# Altium schematic symbol library Regulator_Switching.SchLib: 1070 symbols (part 6 of 9) (continued)
## R-782.5-0.5 (continued)

## R-782.5-1.0
designator *  value R-782.5-1.0
ki_keywords: dc-dc recom Step-Down DC/DC-Regulator; ki_description: 1A Step-Down DC/DC-Regulator, 4.75-18V input, 2.5V fixed Output Voltage, LM78xx replacement, -40°C to +85°C, SIP3; ki_fp_filters: Converter*DCDC*RECOM*R*78E*0.5*; Footprint: Converter_DCDC:Converter_DCDC_RECOM_R-78E-0.5_THT; Supplier: https://www.recom-power.com/pdf/Innoline/R-78xx-1.0.pdf
footprint Converter_DCDC_RECOM_R-78E-0.5_THT
pins: 1 IN (power), 2 GND (power), 3 OUT (power)

## R-783.3-0.5
designator *  value R-783.3-0.5
ki_keywords: dc-dc recom Step-Down DC/DC-Regulator; ki_description: 500mA Step-Down DC/DC-Regulator, 4.75-18V input, 3.3V fixed Output Voltage, LM78xx replacement, -40°C to +85°C, SIP3; ki_fp_filters: Converter*DCDC*RECOM*R*78E*0.5*; Footprint: Converter_DCDC:Converter_DCDC_RECOM_R-78E-0.5_THT; Supplier: https://www.recom-power.com/pdf/Innoline/R-78xx-0.5.pdf
footprint Converter_DCDC_RECOM_R-78E-0.5_THT
pins: 1 IN (power), 2 GND (power), 3 OUT (power)

## R-783.3-1.0
designator *  value R-783.3-1.0
ki_keywords: dc-dc recom Step-Down DC/DC-Regulator; ki_description: 1A Step-Down DC/DC-Regulator, 4.75-18V input, 3.3V fixed Output Voltage, LM78xx replacement, -40°C to +85°C, SIP3; ki_fp_filters: Converter*DCDC*RECOM*R*78E*0.5*; Footprint: Converter_DCDC:Converter_DCDC_RECOM_R-78E-0.5_THT; Supplier: https://www.recom-power.com/pdf/Innoline/R-78xx-1.0.pdf
footprint Converter_DCDC_RECOM_R-78E-0.5_THT
pins: 1 IN (power), 2 GND (power), 3 OUT (power)

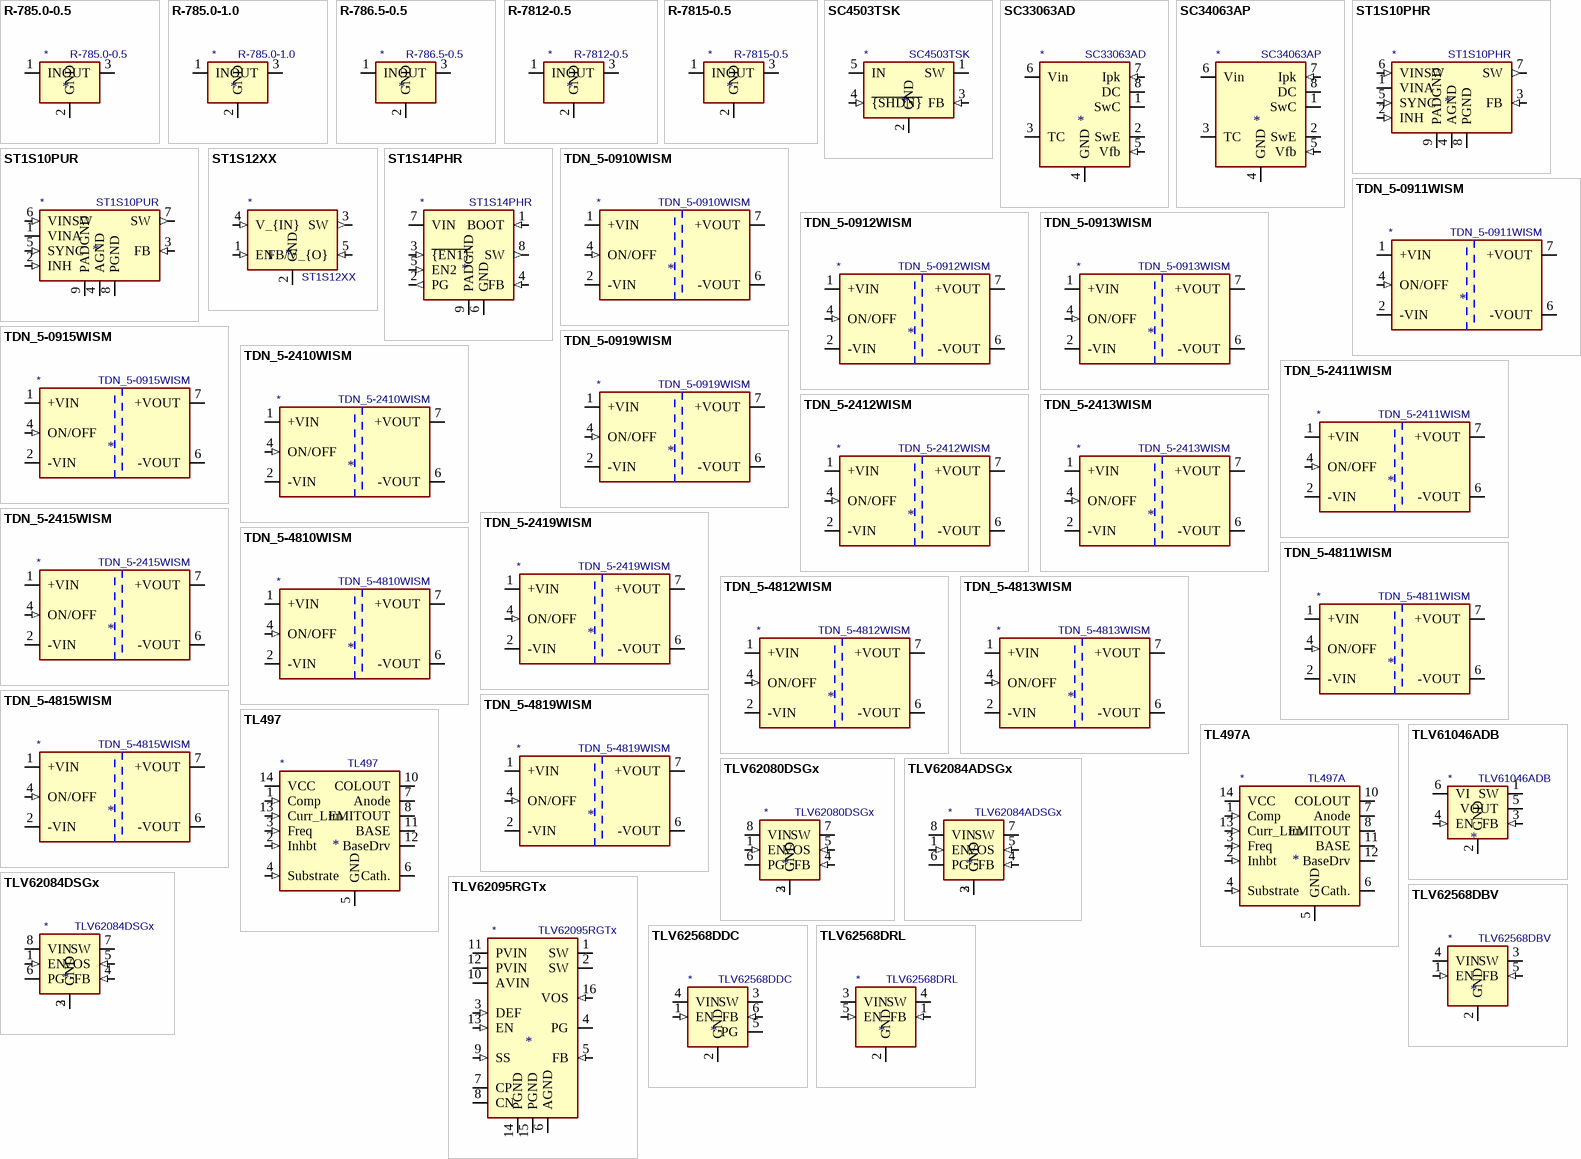
[diagram p18: symbols R-785.0-0.5 to TLV62568DRL]

## R-785.0-0.5
designator *  value R-785.0-0.5
ki_keywords: dc-dc recom Step-Down DC/DC-Regulator; ki_description: 500mA Step-Down DC/DC-Regulator, 6.5-18V input, 5V fixed Output Voltage, LM78xx replacement, -40°C to +85°C, SIP3; ki_fp_filters: Converter*DCDC*RECOM*R*78E*0.5*; Footprint: Converter_DCDC:Converter_DCDC_RECOM_R-78E-0.5_THT; Supplier: https://www.recom-power.com/pdf/Innoline/R-78xx-0.5.pdf
footprint Converter_DCDC_RECOM_R-78E-0.5_THT
pins: 1 IN (power), 2 GND (power), 3 OUT (power)

## R-785.0-1.0
designator *  value R-785.0-1.0
ki_keywords: dc-dc recom Step-Down DC/DC-Regulator; ki_description: 1A Step-Down DC/DC-Regulator, 6.5-18V input, 5V fixed Output Voltage, LM78xx replacement, -40°C to +85°C, SIP3; ki_fp_filters: Converter*DCDC*RECOM*R*78E*0.5*; Footprint: Converter_DCDC:Converter_DCDC_RECOM_R-78E-0.5_THT; Supplier: https://www.recom-power.com/pdf/Innoline/R-78xx-1.0.pdf
footprint Converter_DCDC_RECOM_R-78E-0.5_THT
pins: 1 IN (power), 2 GND (power), 3 OUT (power)

## R-786.5-0.5
designator *  value R-786.5-0.5
ki_keywords: dc-dc recom Step-Down DC/DC-Regulator; ki_description: 500mA Step-Down DC/DC-Regulator, 8-32V input, 6.5V fixed Output Voltage, LM78xx replacement, -40°C to +85°C, SIP3; ki_fp_filters: Converter*DCDC*RECOM*R*78E*0.5*; Footprint: Converter_DCDC:Converter_DCDC_RECOM_R-78E-0.5_THT; Supplier: https://www.recom-power.com/pdf/Innoline/R-78xx-0.5.pdf
footprint Converter_DCDC_RECOM_R-78E-0.5_THT
pins: 1 IN (power), 2 GND (power), 3 OUT (power)

## R-7812-0.5
designator *  value R-7812-0.5
ki_keywords: dc-dc recom Step-Down DC/DC-Regulator; ki_description: 500mA Step-Down DC/DC-Regulator, 15-32V input, 12V fixed Output Voltage, LM78xx replacement, -40°C to +85°C, SIP3; ki_fp_filters: Converter*DCDC*RECOM*R*78E*0.5*; Footprint: Converter_DCDC:Converter_DCDC_RECOM_R-78E-0.5_THT; Supplier: https://www.recom-power.com/pdf/Innoline/R-78xx-0.5.pdf
footprint Converter_DCDC_RECOM_R-78E-0.5_THT
pins: 1 IN (power), 2 GND (power), 3 OUT (power)

## R-7815-0.5
designator *  value R-7815-0.5
ki_keywords: dc-dc recom Step-Down DC/DC-Regulator; ki_description: 500mA Step-Down DC/DC-Regulator, 18-32V input, 15V fixed Output Voltage, LM78xx replacement, -40°C to +85°C, SIP3; ki_fp_filters: Converter*DCDC*RECOM*R*78E*0.5*; Footprint: Converter_DCDC:Converter_DCDC_RECOM_R-78E-0.5_THT; Supplier: https://www.recom-power.com/pdf/Innoline/R-78xx-0.5.pdf
footprint Converter_DCDC_RECOM_R-78E-0.5_THT
pins: 1 IN (power), 2 GND (power), 3 OUT (power)

## SC4503TSK
designator *  value SC4503TSK
ki_keywords: 1.9A 1.3MHz Step-Up DC/DC; ki_description: 1.9A, 1.3MHz Step-Up DC/DC Converter, 2.5V-20V output voltage, TSOT23; ki_fp_filters: TSOT*23*; Footprint: Package_TO_SOT_SMD:TSOT-23-5; Supplier: https://www.semtech.com/uploads/documents/sc4503.pdf
footprint TSOT-23-5
pins: 1 SW, 2 GND (power), 3 FB (in), 4 ~{{SHDN}} (in), 5 IN (power)

## SC33063AD
designator *  value SC33063AD
ki_keywords: smps buck boost inverting; ki_description: 1.5A, step-up/down/inverting switching regulator, 3-40V Vin, 100kHz, SO-8; ki_fp_filters: SOIC*3.9x4.9mm*P1.27mm*; Footprint: Package_SO:SOIC-8_3.9x4.9mm_P1.27mm; Supplier: http://www.onsemi.com/pub_link/Collateral/MC34063A-D.PDF
footprint SOIC-8_3.9x4.9mm_P1.27mm
pins: 1 SwC (oc), 2 SwE (oe), 3 TC, 4 GND (power), 5 Vfb (in), 6 Vin (power), 7 Ipk (in), 8 DC (oc)

## SC34063AP
designator *  value SC34063AP
ki_keywords: smps buck boost inverting; ki_description: 1.5A, step-up/down/inverting switching regulator, 3-40V Vin, 100kHz, DIP-8; ki_fp_filters: DIP*W7.62mm*; Footprint: Package_DIP:DIP-8_W7.62mm; Supplier: http://www.onsemi.com/pub_link/Collateral/MC34063A-D.PDF
footprint DIP-8_W7.62mm
pins: 1 SwC (oc), 2 SwE (oe), 3 TC, 4 GND (power), 5 Vfb (in), 6 Vin (power), 7 Ipk (in), 8 DC (oc)

## ST1S10PHR
designator *  value ST1S10PHR
ki_keywords: DC/DC Buck Conwerter 3A Low Voltage Input; ki_description: 3A monolithic synchronous step-down regulator, Adjustable Output Voltage, 2.5-18V Input Voltage, 900kHz, PowerSO-8; ki_fp_filters: TI*SO*PowerPAD*; Footprint: Package_SO:TI_SO-PowerPAD-8; Supplier: http://www.st.com/internet/com/TECHNICAL_RESOURCES/TECHNICAL_LITERATURE/DATASHEET/CD00169322.pdf
footprint TI_SO-PowerPAD-8
pins: 1 VINA (power), 2 INH (in), 3 FB (in), 4 AGND (power), 5 SYNC (in), 6 VINSW (in), 7 SW (out), 8 PGND (power), 9 PADGND (power)

## ST1S10PUR
designator *  value ST1S10PUR
ki_keywords: DC/DC Buck Conwerter 3A Low Voltage Input; ki_description: 3A monolithic synchronous step-down regulator, Adjustable Output Voltage, 2.5-18V Input Voltage, 900kHz, DFN-8; ki_fp_filters: DFN*EP*4x4mm*P0.8mm*; Footprint: Package_DFN_QFN:DFN-8-1EP_4x4mm_P0.8mm_EP2.5x3.6mm; Supplier: http://www.st.com/internet/com/TECHNICAL_RESOURCES/TECHNICAL_LITERATURE/DATASHEET/CD00169322.pdf
footprint DFN-8-1EP_4x4mm_P0.8mm_EP2.5x3.6mm
pins: 1 VINA (power), 2 INH (in), 3 FB (in), 4 AGND (power), 5 SYNC (in), 6 VINSW (in), 7 SW (out), 8 PGND (power), 9 PADGND (power)

## ST1S12XX
designator *  value ST1S12XX
ki_keywords: DC/DC Buck Converter 0.7A; ki_description: 0.7A synchronous step-down regulator, Adjustable Output Voltage, 2.5-5.5V Input Voltage, 1.7MHz, TSOT-23-5; ki_fp_filters: TSOT?23*; Footprint: Package_TO_SOT_SMD:TSOT-23-5; Supplier: https://www.st.com/resource/en/datasheet/st1s12xx.pdf
footprint TSOT-23-5
pins: 1 EN (in), 2 GND (power), 3 SW (out), 4 V_{IN} (in), 5 FB/V_{O} (in)

## ST1S14PHR
designator *  value ST1S14PHR
ki_keywords: DC/DC Buck Conwerter 3A; ki_description: 3A step-down switching regulator, Adjustable Output Voltage, 5.5-48V Input Voltage, 850kHz, PowerSO-8; ki_fp_filters: TI*SO*PowerPAD*; Footprint: Package_SO:TI_SO-PowerPAD-8; Supplier: http://www.st.com/internet/com/TECHNICAL_RESOURCES/TECHNICAL_LITERATURE/DATASHEET/CD00285678.pdf
footprint TI_SO-PowerPAD-8
pins: 1 BOOT (in), 2 PG (out), 3 ~{{EN1}} (in), 4 FB (in), 5 EN2 (in), 6 GND (power), 7 VIN (power), 8 SW (out), 9 PADGND (power)

## TDN_5-0910WISM
designator *  value TDN_5-0910WISM
ki_keywords: dcdc traco 5W; ki_description: Input 4.5 to 13.2V, Output 3.3V; ki_fp_filters: Converter?DCDC?TRACO?TDN?5*WISM?SMD*; Footprint: Converter_DCDC:Converter_DCDC_TRACO_TDN_5-xxxxWISM_SMD; Supplier: https://assets.tracopower.com/20190626081517/TDN5WISM/documents/tdn5wism-datasheet.pdf
footprint Converter_DCDC_TRACO_TDN_5-xxxxWISM_SMD
pins: 1 +VIN (power), 2 -VIN (power), 4 ON/OFF (in), 5 NC (in) hidden, 6 -VOUT (power), 7 +VOUT (power)

## TDN_5-0911WISM
designator *  value TDN_5-0911WISM
ki_keywords: dcdc traco 5W; ki_description: Input 4.5 to 13.2V, Output 5.0V; ki_fp_filters: Converter?DCDC?TRACO?TDN?5*WISM?SMD*; Footprint: Converter_DCDC:Converter_DCDC_TRACO_TDN_5-xxxxWISM_SMD; Supplier: https://assets.tracopower.com/20190626081517/TDN5WISM/documents/tdn5wism-datasheet.pdf
footprint Converter_DCDC_TRACO_TDN_5-xxxxWISM_SMD
pins: 1 +VIN (power), 2 -VIN (power), 4 ON/OFF (in), 5 NC (in) hidden, 6 -VOUT (power), 7 +VOUT (power)

## TDN_5-0912WISM
designator *  value TDN_5-0912WISM
ki_keywords: dcdc traco 5W; ki_description: Input 4.5 to 13.2V, Output 12.0V; ki_fp_filters: Converter?DCDC?TRACO?TDN?5*WISM?SMD*; Footprint: Converter_DCDC:Converter_DCDC_TRACO_TDN_5-xxxxWISM_SMD; Supplier: https://assets.tracopower.com/20190626081517/TDN5WISM/documents/tdn5wism-datasheet.pdf
footprint Converter_DCDC_TRACO_TDN_5-xxxxWISM_SMD
pins: 1 +VIN (power), 2 -VIN (power), 4 ON/OFF (in), 5 NC (in) hidden, 6 -VOUT (power), 7 +VOUT (power)

## TDN_5-0913WISM
designator *  value TDN_5-0913WISM
ki_keywords: dcdc traco 5W; ki_description: Input 4.5 to 13.2V, Output 15.0V; ki_fp_filters: Converter?DCDC?TRACO?TDN?5*WISM?SMD*; Footprint: Converter_DCDC:Converter_DCDC_TRACO_TDN_5-xxxxWISM_SMD; Supplier: https://assets.tracopower.com/20190626081517/TDN5WISM/documents/tdn5wism-datasheet.pdf
footprint Converter_DCDC_TRACO_TDN_5-xxxxWISM_SMD
pins: 1 +VIN (power), 2 -VIN (power), 4 ON/OFF (in), 5 NC (in) hidden, 6 -VOUT (power), 7 +VOUT (power)

## TDN_5-0915WISM
designator *  value TDN_5-0915WISM
ki_keywords: dcdc traco 5W; ki_description: Input 4.5 to 13.2V, Output 24.0V; ki_fp_filters: Converter?DCDC?TRACO?TDN?5*WISM?SMD*; Footprint: Converter_DCDC:Converter_DCDC_TRACO_TDN_5-xxxxWISM_SMD; Supplier: https://assets.tracopower.com/20190626081517/TDN5WISM/documents/tdn5wism-datasheet.pdf
footprint Converter_DCDC_TRACO_TDN_5-xxxxWISM_SMD
pins: 1 +VIN (power), 2 -VIN (power), 4 ON/OFF (in), 5 NC (in) hidden, 6 -VOUT (power), 7 +VOUT (power)

## TDN_5-0919WISM
designator *  value TDN_5-0919WISM
ki_keywords: dcdc traco 5W; ki_description: Input 4.5 to 13.2V, Output 9.0V; ki_fp_filters: Converter?DCDC?TRACO?TDN?5*WISM?SMD*; Footprint: Converter_DCDC:Converter_DCDC_TRACO_TDN_5-xxxxWISM_SMD; Supplier: https://assets.tracopower.com/20190626081517/TDN5WISM/documents/tdn5wism-datasheet.pdf
footprint Converter_DCDC_TRACO_TDN_5-xxxxWISM_SMD
pins: 1 +VIN (power), 2 -VIN (power), 4 ON/OFF (in), 5 NC (in) hidden, 6 -VOUT (power), 7 +VOUT (power)

## TDN_5-2410WISM
designator *  value TDN_5-2410WISM
ki_keywords: dcdc traco 5W; ki_description: Input 9.0 to 36.0V, Output 3.3V; ki_fp_filters: Converter?DCDC?TRACO?TDN?5*WISM?SMD*; Footprint: Converter_DCDC:Converter_DCDC_TRACO_TDN_5-xxxxWISM_SMD; Supplier: https://assets.tracopower.com/20190626081517/TDN5WISM/documents/tdn5wism-datasheet.pdf
footprint Converter_DCDC_TRACO_TDN_5-xxxxWISM_SMD
pins: 1 +VIN (power), 2 -VIN (power), 4 ON/OFF (in), 5 NC (in) hidden, 6 -VOUT (power), 7 +VOUT (power)

## TDN_5-2411WISM
designator *  value TDN_5-2411WISM
ki_keywords: dcdc traco 5W; ki_description: Input 9.0 to 36.0V, Output 5.0V; ki_fp_filters: Converter?DCDC?TRACO?TDN?5*WISM?SMD*; Footprint: Converter_DCDC:Converter_DCDC_TRACO_TDN_5-xxxxWISM_SMD; Supplier: https://assets.tracopower.com/20190626081517/TDN5WISM/documents/tdn5wism-datasheet.pdf
footprint Converter_DCDC_TRACO_TDN_5-xxxxWISM_SMD
pins: 1 +VIN (power), 2 -VIN (power), 4 ON/OFF (in), 5 NC (in) hidden, 6 -VOUT (power), 7 +VOUT (power)

## TDN_5-2412WISM
designator *  value TDN_5-2412WISM
ki_keywords: dcdc traco 5W; ki_description: Input 9.0 to 36.0V, Output 12.0V; ki_fp_filters: Converter?DCDC?TRACO?TDN?5*WISM?SMD*; Footprint: Converter_DCDC:Converter_DCDC_TRACO_TDN_5-xxxxWISM_SMD; Supplier: https://assets.tracopower.com/20190626081517/TDN5WISM/documents/tdn5wism-datasheet.pdf
footprint Converter_DCDC_TRACO_TDN_5-xxxxWISM_SMD
pins: 1 +VIN (power), 2 -VIN (power), 4 ON/OFF (in), 5 NC (in) hidden, 6 -VOUT (power), 7 +VOUT (power)

## TDN_5-2413WISM
designator *  value TDN_5-2413WISM
ki_keywords: dcdc traco 5W; ki_description: Input 9.0 to 36.0V, Output 15.0V; ki_fp_filters: Converter?DCDC?TRACO?TDN?5*WISM?SMD*; Footprint: Converter_DCDC:Converter_DCDC_TRACO_TDN_5-xxxxWISM_SMD; Supplier: https://assets.tracopower.com/20190626081517/TDN5WISM/documents/tdn5wism-datasheet.pdf
footprint Converter_DCDC_TRACO_TDN_5-xxxxWISM_SMD
pins: 1 +VIN (power), 2 -VIN (power), 4 ON/OFF (in), 5 NC (in) hidden, 6 -VOUT (power), 7 +VOUT (power)

## TDN_5-2415WISM
designator *  value TDN_5-2415WISM
ki_keywords: dcdc traco 5W; ki_description: Input 9.0 to 36.0V, Output 24.0V; ki_fp_filters: Converter?DCDC?TRACO?TDN?5*WISM?SMD*; Footprint: Converter_DCDC:Converter_DCDC_TRACO_TDN_5-xxxxWISM_SMD; Supplier: https://assets.tracopower.com/20190626081517/TDN5WISM/documents/tdn5wism-datasheet.pdf
footprint Converter_DCDC_TRACO_TDN_5-xxxxWISM_SMD
pins: 1 +VIN (power), 2 -VIN (power), 4 ON/OFF (in), 5 NC (in) hidden, 6 -VOUT (power), 7 +VOUT (power)

## TDN_5-2419WISM
designator *  value TDN_5-2419WISM
ki_keywords: dcdc traco 5WW; ki_description: Input 9.0 to 36.0V, Output 9.0V; ki_fp_filters: Converter?DCDC?TRACO?TDN?5*WISM?SMD*; Footprint: Converter_DCDC:Converter_DCDC_TRACO_TDN_5-xxxxWISM_SMD; Supplier: https://assets.tracopower.com/20190626081517/TDN5WISM/documents/tdn5wism-datasheet.pdf
footprint Converter_DCDC_TRACO_TDN_5-xxxxWISM_SMD
pins: 1 +VIN (power), 2 -VIN (power), 4 ON/OFF (in), 5 NC (in) hidden, 6 -VOUT (power), 7 +VOUT (power)

## TDN_5-4810WISM
designator *  value TDN_5-4810WISM
ki_keywords: dcdc traco 5W; ki_description: Input 18.0 to 75.0V, Output 3.3V; ki_fp_filters: Converter?DCDC?TRACO?TDN?5*WISM?SMD*; Footprint: Converter_DCDC:Converter_DCDC_TRACO_TDN_5-xxxxWISM_SMD; Supplier: https://assets.tracopower.com/20190626081517/TDN5WISM/documents/tdn5wism-datasheet.pdf
footprint Converter_DCDC_TRACO_TDN_5-xxxxWISM_SMD
pins: 1 +VIN (power), 2 -VIN (power), 4 ON/OFF (in), 5 NC (in) hidden, 6 -VOUT (power), 7 +VOUT (power)

## TDN_5-4811WISM
designator *  value TDN_5-4811WISM
ki_keywords: dcdc traco 5W; ki_description: Input 18.0 to 75.0V, Output 5.0V; ki_fp_filters: Converter?DCDC?TRACO?TDN?5*WISM?SMD*; Footprint: Converter_DCDC:Converter_DCDC_TRACO_TDN_5-xxxxWISM_SMD; Supplier: https://assets.tracopower.com/20190626081517/TDN5WISM/documents/tdn5wism-datasheet.pdf
footprint Converter_DCDC_TRACO_TDN_5-xxxxWISM_SMD
pins: 1 +VIN (power), 2 -VIN (power), 4 ON/OFF (in), 5 NC (in) hidden, 6 -VOUT (power), 7 +VOUT (power)

## TDN_5-4812WISM
designator *  value TDN_5-4812WISM
ki_keywords: dcdc traco 5W; ki_description: Input 18.0 to 75.0V, Output 12.0V; ki_fp_filters: Converter?DCDC?TRACO?TDN?5*WISM?SMD*; Footprint: Converter_DCDC:Converter_DCDC_TRACO_TDN_5-xxxxWISM_SMD; Supplier: https://assets.tracopower.com/20190626081517/TDN5WISM/documents/tdn5wism-datasheet.pdf
footprint Converter_DCDC_TRACO_TDN_5-xxxxWISM_SMD
pins: 1 +VIN (power), 2 -VIN (power), 4 ON/OFF (in), 5 NC (in) hidden, 6 -VOUT (power), 7 +VOUT (power)

## TDN_5-4813WISM
designator *  value TDN_5-4813WISM
ki_keywords: dcdc traco 5W; ki_description: Input 18.0 to 75.0V, Output 15.0V; ki_fp_filters: Converter?DCDC?TRACO?TDN?5*WISM?SMD*; Footprint: Converter_DCDC:Converter_DCDC_TRACO_TDN_5-xxxxWISM_SMD; Supplier: https://assets.tracopower.com/20190626081517/TDN5WISM/documents/tdn5wism-datasheet.pdf
footprint Converter_DCDC_TRACO_TDN_5-xxxxWISM_SMD
pins: 1 +VIN (power), 2 -VIN (power), 4 ON/OFF (in), 5 NC (in) hidden, 6 -VOUT (power), 7 +VOUT (power)

## TDN_5-4815WISM
designator *  value TDN_5-4815WISM
ki_keywords: dcdc traco 5W; ki_description: Input 18.0 to 75.0V, Output 24.0V; ki_fp_filters: Converter?DCDC?TRACO?TDN?5*WISM?SMD*; Footprint: Converter_DCDC:Converter_DCDC_TRACO_TDN_5-xxxxWISM_SMD; Supplier: https://assets.tracopower.com/20190626081517/TDN5WISM/documents/tdn5wism-datasheet.pdf
footprint Converter_DCDC_TRACO_TDN_5-xxxxWISM_SMD
pins: 1 +VIN (power), 2 -VIN (power), 4 ON/OFF (in), 5 NC (in) hidden, 6 -VOUT (power), 7 +VOUT (power)

## TDN_5-4819WISM
designator *  value TDN_5-4819WISM
ki_keywords: dcdc traco 5W; ki_description: Input 18.0 to 75.0V, Output 9.0V; ki_fp_filters: Converter?DCDC?TRACO?TDN?5*WISM?SMD*; Footprint: Converter_DCDC:Converter_DCDC_TRACO_TDN_5-xxxxWISM_SMD; Supplier: https://assets.tracopower.com/20190626081517/TDN5WISM/documents/tdn5wism-datasheet.pdf
footprint Converter_DCDC_TRACO_TDN_5-xxxxWISM_SMD
pins: 1 +VIN (power), 2 -VIN (power), 4 ON/OFF (in), 5 NC (in) hidden, 6 -VOUT (power), 7 +VOUT (power)

## TL497
designator *  value TL497
ki_keywords: buck regulator; ki_description: 500mA step up/step down/inverting switching voltage regulator, SIP-14/SOIC-14(W); ki_fp_filters: DIP*W7.62mm* SOIC*7.5x9.0mm*P1.27mm* SOIC*3.9x8.7mm*P1.27mm*; Supplier: http://www.ti.com/lit/ds/symlink/tl497a.pdf
pins: 1 Comp (in), 2 Inhbt (in), 3 Freq (in), 4 Substrate (in), 5 GND (power), 6 Cath., 7 Anode, 8 EMITOUT (oe), 9 NC (in) hidden, 10 COLOUT (oc), 11 BASE, 12 BaseDrv, 13 Curr_Lim (in), 14 VCC (power)

## TL497A
designator *  value TL497A
ki_keywords: buck regulator; ki_description: 500mA step up/step down switching regulator; ki_fp_filters: DIP*W7.62mm* SOIC*7.5x9.0mm*P1.27mm* SOIC*3.9x8.7mm*P1.27mm*; Supplier: http://www.ti.com/lit/ds/symlink/tl497a.pdf
pins: 1 Comp (in), 2 Inhbt (in), 3 Freq (in), 4 Substrate (in), 5 GND (power), 6 Cath., 7 Anode, 8 EMITOUT (oe), 9 NC (in) hidden, 10 COLOUT (oc), 11 BASE, 12 BaseDrv, 13 Curr_Lim (in), 14 VCC (power)

## TLV61046ADB
designator *  value TLV61046ADB
ki_keywords: Step-Up DC-DC Converter; ki_description: 28-V Output Voltage Boost Converter with Power Diode and Isolation Switch, SOT-23-6; ki_fp_filters: SOT?23*; Footprint: Package_TO_SOT_SMD:SOT-23-6; Supplier: http://www.ti.com/lit/ds/symlink/tlv61046a.pdf
footprint SOT-23-6
pins: 1 SW (power), 2 GND (power), 3 FB (in), 4 EN (in), 5 VOUT (power), 6 VI (power)

## TLV62080DSGx
designator *  value TLV62080DSGx
ki_keywords: Synchronous Buck; ki_description: High-efficiency Step-down Converter; ki_fp_filters: *WSON?8?1EP*2x2mm*P0.5mm*; Footprint: Package_SON:WSON-8-1EP_2x2mm_P0.5mm_EP0.9x1.6mm; Supplier: http://www.ti.com/lit/ds/symlink/tlv62080.pdf
footprint WSON-8-1EP_2x2mm_P0.5mm_EP0.9x1.6mm
pins: 1 EN (in), 2 GND (power), 3 GND (power), 4 FB (in), 5 VOS (in), 6 PG (oc), 7 SW (power), 8 VIN (power), 9 GND hidden

## TLV62084ADSGx
designator *  value TLV62084ADSGx
ki_keywords: Synchronous Buck; ki_description: High-efficiency Step-down Converter; ki_fp_filters: *WSON?8?1EP*2x2mm*P0.5mm*; Footprint: Package_SON:WSON-8-1EP_2x2mm_P0.5mm_EP0.9x1.6mm; Supplier: http://www.ti.com/lit/ds/symlink/tlv62080.pdf
footprint WSON-8-1EP_2x2mm_P0.5mm_EP0.9x1.6mm
pins: 1 EN (in), 2 GND (power), 3 GND (power), 4 FB (in), 5 VOS (in), 6 PG (oc), 7 SW (power), 8 VIN (power), 9 GND hidden

## TLV62084DSGx
designator *  value TLV62084DSGx
ki_keywords: Synchronous Buck; ki_description: High-efficiency Step-down Converter; ki_fp_filters: *WSON?8?1EP*2x2mm*P0.5mm*; Footprint: Package_SON:WSON-8-1EP_2x2mm_P0.5mm_EP0.9x1.6mm; Supplier: http://www.ti.com/lit/ds/symlink/tlv62080.pdf
footprint WSON-8-1EP_2x2mm_P0.5mm_EP0.9x1.6mm
pins: 1 EN (in), 2 GND (power), 3 GND (power), 4 FB (in), 5 VOS (in), 6 PG (oc), 7 SW (power), 8 VIN (power), 9 GND hidden

## TLV62095RGTx
designator *  value TLV62095RGTx
ki_keywords: Synchronous Buck; ki_description: High efficiency step-down converter; ki_fp_filters: VQFN*1EP*3x3mm*P0.5mm*; Footprint: Package_DFN_QFN:VQFN-16-1EP_3x3mm_P0.5mm_EP1.68x1.68mm_ThermalVias; Supplier: http://www.ti.com/lit/ds/symlink/tlv62095.pdf
footprint VQFN-16-1EP_3x3mm_P0.5mm_EP1.68x1.68mm_ThermalVias
pins: 1 SW (power), 2 SW (power), 3 DEF (in), 4 PG (hiz), 5 FB (in), 6 AGND (power), 7 CP, 8 CN, 9 SS (in), 10 AVIN (power), 11 PVIN (power), 12 PVIN (power), 13 EN (in), 14 PGND (power), 15 PGND (power), 16 VOS (in), 17 AGND (power) hidden

## TLV62568DBV
designator *  value TLV62568DBV
ki_keywords: Step-Down Buck DC-DC Regulator Adjustable; ki_description: High Efficiency Synchronous Buck Converter, Adjustable Output 0.6V-5.5V, 1A, SOT-23-5; ki_fp_filters: SOT?23*; Footprint: Package_TO_SOT_SMD:SOT-23-5; Supplier: http://www.ti.com/lit/ds/symlink/tlv62568.pdf
footprint SOT-23-5
pins: 1 EN (in), 2 GND (power), 3 SW (power), 4 VIN (power), 5 FB (in)

## TLV62568DDC
designator *  value TLV62568DDC
ki_keywords: Step-Down Buck DC-DC Regulator Adjustable; ki_description: High Efficiency Synchronous Buck Converter, Adjustable Output 0.6V-5.5V, 1A, SOT-23-6; ki_fp_filters: SOT?23*; Footprint: Package_TO_SOT_SMD:SOT-23-6; Supplier: http://www.ti.com/lit/ds/symlink/tlv62568.pdf
footprint SOT-23-6
pins: 1 EN (in), 2 GND (power), 3 SW (power), 4 VIN (power), 5 PG (oc), 6 FB (in)

## TLV62568DRL
designator *  value TLV62568DRL
ki_keywords: Step-Down Buck DC-DC Regulator Adjustable; ki_description: High Efficiency Synchronous Buck Converter, Adjustable Output 0.6V-5.5V, 1A, SOT-563-6; ki_fp_filters: SOT*563*; Footprint: Package_TO_SOT_SMD:SOT-563; Supplier: http://www.ti.com/lit/ds/symlink/tlv62568.pdf
footprint SOT-563
pins: 1 FB (in), 2 GND (power), 3 VIN (power), 4 SW (power), 5 EN (in), 6 NC (in) hidden

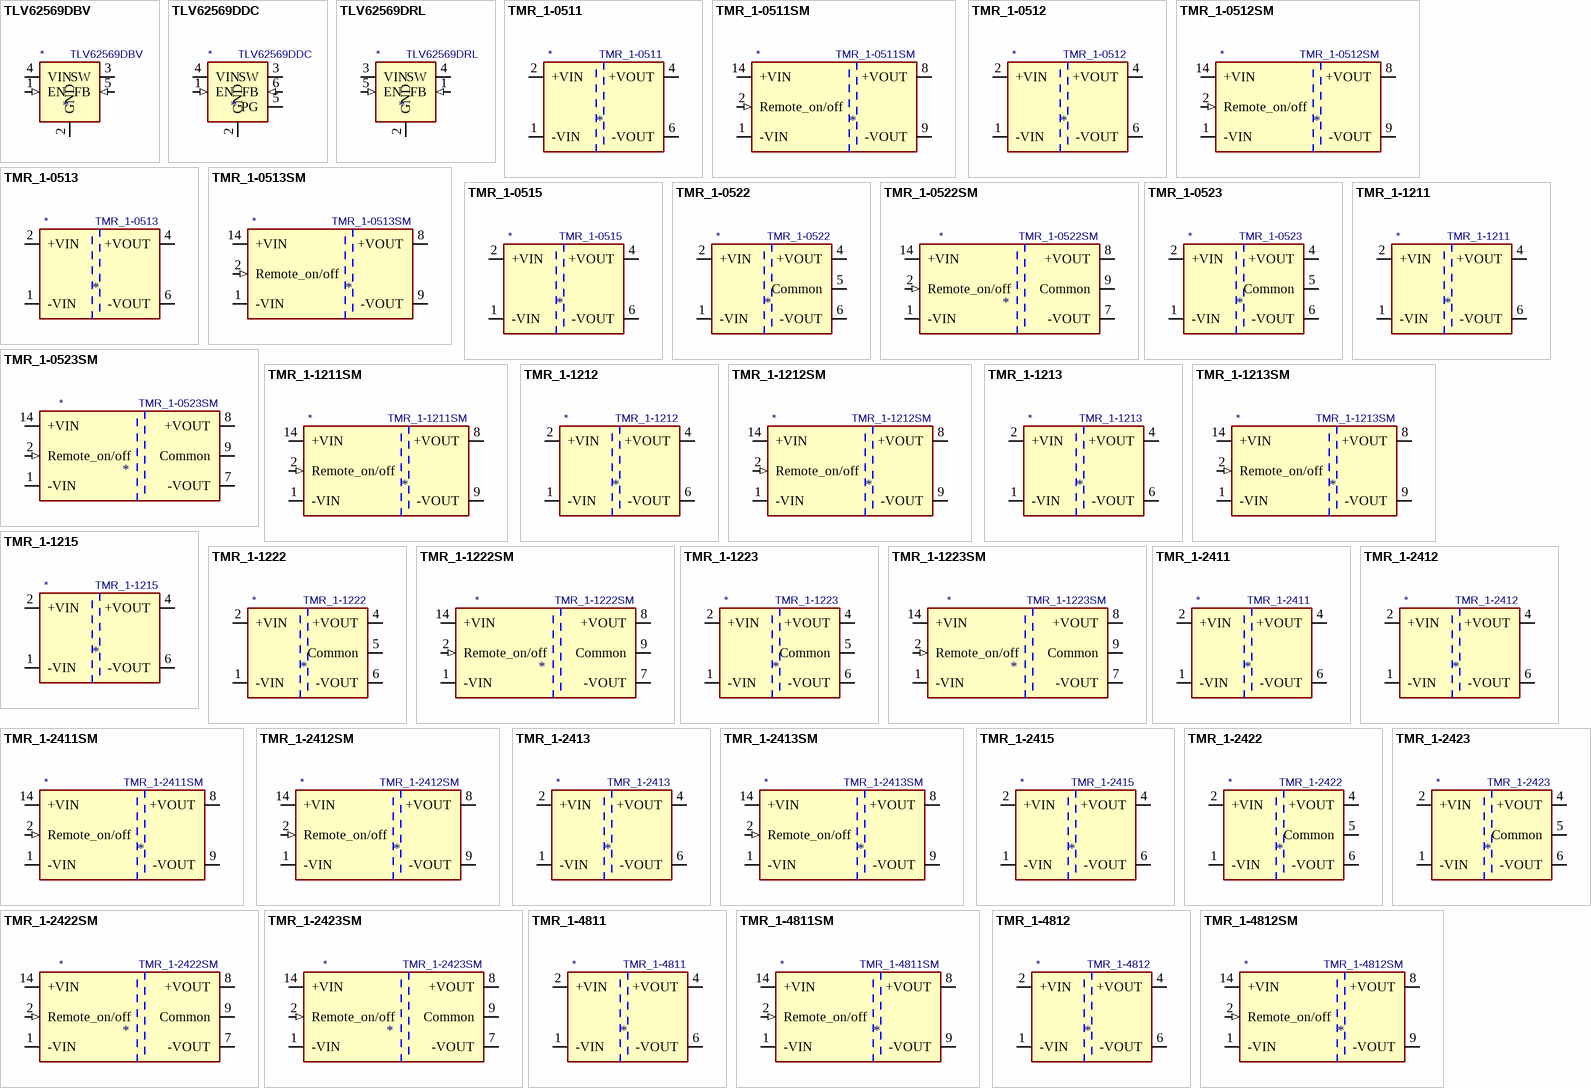
[diagram p19: symbols TLV62569DBV to TMR_1-4812SM]

## TLV62569DBV
designator *  value TLV62569DBV
ki_keywords: Step-Down Buck DC-DC Regulator Adjustable; ki_description: High Efficiency Synchronous Buck Converter, Adjustable Output 0.6V-5.5V, 2A, SOT-23-5; ki_fp_filters: SOT?23*; Footprint: Package_TO_SOT_SMD:SOT-23-5; Supplier: http://www.ti.com/lit/ds/symlink/tlv62569.pdf
footprint SOT-23-5
pins: 1 EN (in), 2 GND (power), 3 SW (power), 4 VIN (power), 5 FB (in)

## TLV62569DDC
designator *  value TLV62569DDC
ki_keywords: Step-Down Buck DC-DC Regulator Adjustable; ki_description: High Efficiency Synchronous Buck Converter, Adjustable Output 0.6V-5.5V, 2A, SOT-23-6; ki_fp_filters: SOT?23*; Footprint: Package_TO_SOT_SMD:SOT-23-6; Supplier: http://www.ti.com/lit/ds/symlink/tlv62569.pdf
footprint SOT-23-6
pins: 1 EN (in), 2 GND (power), 3 SW (power), 4 VIN (power), 5 PG (oc), 6 FB (in)

## TLV62569DRL
designator *  value TLV62569DRL
ki_keywords: Step-Down Buck DC-DC Regulator Adjustable; ki_description: High Efficiency Synchronous Buck Converter, Adjustable Output 0.6V-5.5V, 2A, SOT-563-6; ki_fp_filters: SOT*563*; Footprint: Package_TO_SOT_SMD:SOT-563; Supplier: http://www.ti.com/lit/ds/symlink/tlv62569.pdf
footprint SOT-563
pins: 1 FB (in), 2 GND (power), 3 VIN (power), 4 SW (power), 5 EN (in), 6 NC (in) hidden

## TMR_1-0511
designator *  value TMR_1-0511
ki_keywords: Murata isolated isolation dc-dc converter transformer; ki_description: 200mA Regulated 1W DC/DC converter with 1.5kV isolation, 4.5V-9V input, 5V fixed Output Voltage, SIP-6; ki_fp_filters: Converter*DCDC*TRACO*TMR?1*Single*; Footprint: Converter_DCDC:Converter_DCDC_TRACO_TMR-1-xxxx_Single_THT; Supplier: http://assets.tracopower.com/TMR1/documents/tmr1-datasheet.pdf
footprint Converter_DCDC_TRACO_TMR-1-xxxx_Single_THT
pins: 1 -VIN (power), 2 +VIN (power), 4 +VOUT (power), 6 -VOUT (power)

## TMR_1-0511SM
designator *  value TMR_1-0511SM
ki_keywords: Murata isolated isolation dc-dc converter transformer; ki_description: 200mA Regulated 1W DC/DC converter with 1.5kV isolation, 4.5V-9V input, 5V fixed Output Voltage, SMD; ki_fp_filters: Converter*DCDC*TRACO*TMR?1SM*; Footprint: Converter_DCDC:Converter_DCDC_TRACO_TMR-1SM_SMD; Supplier: http://assets.tracopower.com/TMR1SM/documents/tmr1sm-datasheet.pdf
footprint Converter_DCDC_TRACO_TMR-1SM_SMD
pins: 1 -VIN (power), 2 Remote_on/off (in), 6 NC (in) hidden, 7 NC (in) hidden, 8 +VOUT (power), 9 -VOUT (power), 14 +VIN (power)

## TMR_1-0512
designator *  value TMR_1-0512
ki_keywords: Murata isolated isolation dc-dc converter transformer; ki_description: 83mA Regulated 1W DC/DC converter with 1.5kV isolation, 4.5V-9V input, 12V fixed Output Voltage, SIP-6; ki_fp_filters: Converter*DCDC*TRACO*TMR?1*Single*; Footprint: Converter_DCDC:Converter_DCDC_TRACO_TMR-1-xxxx_Single_THT; Supplier: http://assets.tracopower.com/TMR1/documents/tmr1-datasheet.pdf
footprint Converter_DCDC_TRACO_TMR-1-xxxx_Single_THT
pins: 1 -VIN (power), 2 +VIN (power), 4 +VOUT (power), 6 -VOUT (power)

## TMR_1-0512SM
designator *  value TMR_1-0512SM
ki_keywords: Murata isolated isolation dc-dc converter transformer; ki_description: 83mA Regulated 1W DC/DC converter with 1.5kV isolation, 4.5V-9V input, 12V fixed Output Voltage, SMD; ki_fp_filters: Converter*DCDC*TRACO*TMR?1SM*; Footprint: Converter_DCDC:Converter_DCDC_TRACO_TMR-1SM_SMD; Supplier: http://assets.tracopower.com/TMR1SM/documents/tmr1sm-datasheet.pdf
footprint Converter_DCDC_TRACO_TMR-1SM_SMD
pins: 1 -VIN (power), 2 Remote_on/off (in), 6 NC (in) hidden, 7 NC (in) hidden, 8 +VOUT (power), 9 -VOUT (power), 14 +VIN (power)

## TMR_1-0513
designator *  value TMR_1-0513
ki_keywords: Murata isolated isolation dc-dc converter transformer; ki_description: 67mA Regulated 1W DC/DC converter with 1.5kV isolation, 4.5V-9V input, 15V fixed Output Voltage, SIP-6; ki_fp_filters: Converter*DCDC*TRACO*TMR?1*Single*; Footprint: Converter_DCDC:Converter_DCDC_TRACO_TMR-1-xxxx_Single_THT; Supplier: http://assets.tracopower.com/TMR1/documents/tmr1-datasheet.pdf
footprint Converter_DCDC_TRACO_TMR-1-xxxx_Single_THT
pins: 1 -VIN (power), 2 +VIN (power), 4 +VOUT (power), 6 -VOUT (power)

## TMR_1-0513SM
designator *  value TMR_1-0513SM
ki_keywords: Murata isolated isolation dc-dc converter transformer; ki_description: 67mA Regulated 1W DC/DC converter with 1.5kV isolation, 4.5V-9V input, 15V fixed Output Voltage, SMD; ki_fp_filters: Converter*DCDC*TRACO*TMR?1SM*; Footprint: Converter_DCDC:Converter_DCDC_TRACO_TMR-1SM_SMD; Supplier: http://assets.tracopower.com/TMR1SM/documents/tmr1sm-datasheet.pdf
footprint Converter_DCDC_TRACO_TMR-1SM_SMD
pins: 1 -VIN (power), 2 Remote_on/off (in), 6 NC (in) hidden, 7 NC (in) hidden, 8 +VOUT (power), 9 -VOUT (power), 14 +VIN (power)

## TMR_1-0515
designator *  value TMR_1-0515
ki_keywords: Murata isolated isolation dc-dc converter transformer; ki_description: 42mA Regulated 1W DC/DC converter with 1.5kV isolation, 4.5V-9V input, 24V fixed Output Voltage, SIP-6; ki_fp_filters: Converter*DCDC*TRACO*TMR?1*Single*; Footprint: Converter_DCDC:Converter_DCDC_TRACO_TMR-1-xxxx_Single_THT; Supplier: http://assets.tracopower.com/TMR1/documents/tmr1-datasheet.pdf
footprint Converter_DCDC_TRACO_TMR-1-xxxx_Single_THT
pins: 1 -VIN (power), 2 +VIN (power), 4 +VOUT (power), 6 -VOUT (power)

## TMR_1-0522
designator *  value TMR_1-0522
ki_keywords: Murata isolated isolation dc-dc converter transformer; ki_description: +/-42mA Regulated 1W DC/DC converter with 1.5kV isolation, 4.5V-9V input, +/-12V fixed Output Voltage, SIP-6; ki_fp_filters: Converter*DCDC*TRACO*TMR?1*Dual*; Footprint: Converter_DCDC:Converter_DCDC_TRACO_TMR-1-xxxx_Dual_THT; Supplier: http://assets.tracopower.com/TMR1/documents/tmr1-datasheet.pdf
footprint Converter_DCDC_TRACO_TMR-1-xxxx_Dual_THT
pins: 1 -VIN (power), 2 +VIN (power), 4 +VOUT (power), 5 Common (power), 6 -VOUT (power)

## TMR_1-0522SM
designator *  value TMR_1-0522SM
ki_keywords: Murata isolated isolation dc-dc converter transformer; ki_description: +/-42mA Regulated 1W DC/DC converter with 1.5kV isolation, 4.5V-9V input, +/-12V fixed Output Voltage, SMD; ki_fp_filters: Converter*DCDC*TRACO*TMR-1SM*SMD*; Footprint: Converter_DCDC:Converter_DCDC_TRACO_TMR-1SM_SMD; Supplier: http://assets.tracopower.com/TMR1SM/documents/tmr1sm-datasheet.pdf
footprint Converter_DCDC_TRACO_TMR-1SM_SMD
pins: 1 -VIN (power), 2 Remote_on/off (in), 6 Common hidden, 7 -VOUT (power), 8 +VOUT (power), 9 Common (power), 14 +VIN (power)

## TMR_1-0523
designator *  value TMR_1-0523
ki_keywords: Murata isolated isolation dc-dc converter transformer; ki_description: +/-33mA Regulated 1W DC/DC converter with 1.5kV isolation, 4.5V-9V input, +/-15V fixed Output Voltage, SIP-6; ki_fp_filters: Converter*DCDC*TRACO*TMR?1*Dual*; Footprint: Converter_DCDC:Converter_DCDC_TRACO_TMR-1-xxxx_Dual_THT; Supplier: http://assets.tracopower.com/TMR1/documents/tmr1-datasheet.pdf
footprint Converter_DCDC_TRACO_TMR-1-xxxx_Dual_THT
pins: 1 -VIN (power), 2 +VIN (power), 4 +VOUT (power), 5 Common (power), 6 -VOUT (power)

## TMR_1-0523SM
designator *  value TMR_1-0523SM
ki_keywords: Murata isolated isolation dc-dc converter transformer; ki_description: +/-33mA Regulated 1W DC/DC converter with 1.5kV isolation, 4.5V-9V input, +/-15V fixed Output Voltage, SMD; ki_fp_filters: Converter*DCDC*TRACO*TMR-1SM*SMD*; Footprint: Converter_DCDC:Converter_DCDC_TRACO_TMR-1SM_SMD; Supplier: http://assets.tracopower.com/TMR1SM/documents/tmr1sm-datasheet.pdf
footprint Converter_DCDC_TRACO_TMR-1SM_SMD
pins: 1 -VIN (power), 2 Remote_on/off (in), 6 Common hidden, 7 -VOUT (power), 8 +VOUT (power), 9 Common (power), 14 +VIN (power)

## TMR_1-1211
designator *  value TMR_1-1211
ki_keywords: Murata isolated isolation dc-dc converter transformer; ki_description: 200mA Regulated 1W DC/DC converter with 1.5kV isolation, 9V-18V input, 5V fixed Output Voltage, SIP-6; ki_fp_filters: Converter*DCDC*TRACO*TMR?1*Single*; Footprint: Converter_DCDC:Converter_DCDC_TRACO_TMR-1-xxxx_Single_THT; Supplier: http://assets.tracopower.com/TMR1/documents/tmr1-datasheet.pdf
footprint Converter_DCDC_TRACO_TMR-1-xxxx_Single_THT
pins: 1 -VIN (power), 2 +VIN (power), 4 +VOUT (power), 6 -VOUT (power)

## TMR_1-1211SM
designator *  value TMR_1-1211SM
ki_keywords: Murata isolated isolation dc-dc converter transformer; ki_description: 200mA Regulated 1W DC/DC converter with 1.5kV isolation, 9V-18V input, 5V fixed Output Voltage, SMD; ki_fp_filters: Converter*DCDC*TRACO*TMR?1SM*; Footprint: Converter_DCDC:Converter_DCDC_TRACO_TMR-1SM_SMD; Supplier: http://assets.tracopower.com/TMR1SM/documents/tmr1sm-datasheet.pdf
footprint Converter_DCDC_TRACO_TMR-1SM_SMD
pins: 1 -VIN (power), 2 Remote_on/off (in), 6 NC (in) hidden, 7 NC (in) hidden, 8 +VOUT (power), 9 -VOUT (power), 14 +VIN (power)

## TMR_1-1212
designator *  value TMR_1-1212
ki_keywords: Murata isolated isolation dc-dc converter transformer; ki_description: 83mA Regulated 1W DC/DC converter with 1.5kV isolation, 9V-18V input, 12V fixed Output Voltage, SIP-6; ki_fp_filters: Converter*DCDC*TRACO*TMR?1*Single*; Footprint: Converter_DCDC:Converter_DCDC_TRACO_TMR-1-xxxx_Single_THT; Supplier: http://assets.tracopower.com/TMR1/documents/tmr1-datasheet.pdf
footprint Converter_DCDC_TRACO_TMR-1-xxxx_Single_THT
pins: 1 -VIN (power), 2 +VIN (power), 4 +VOUT (power), 6 -VOUT (power)

## TMR_1-1212SM
designator *  value TMR_1-1212SM
ki_keywords: Murata isolated isolation dc-dc converter transformer; ki_description: 83mA Regulated 1W DC/DC converter with 1.5kV isolation, 9V-18V input, 12V fixed Output Voltage, SMD; ki_fp_filters: Converter*DCDC*TRACO*TMR?1SM*; Footprint: Converter_DCDC:Converter_DCDC_TRACO_TMR-1SM_SMD; Supplier: http://assets.tracopower.com/TMR1SM/documents/tmr1sm-datasheet.pdf
footprint Converter_DCDC_TRACO_TMR-1SM_SMD
pins: 1 -VIN (power), 2 Remote_on/off (in), 6 NC (in) hidden, 7 NC (in) hidden, 8 +VOUT (power), 9 -VOUT (power), 14 +VIN (power)

## TMR_1-1213
designator *  value TMR_1-1213
ki_keywords: Murata isolated isolation dc-dc converter transformer; ki_description: 67mA Regulated 1W DC/DC converter with 1.5kV isolation, 9V-18V input, 15V fixed Output Voltage, SIP-6; ki_fp_filters: Converter*DCDC*TRACO*TMR?1*Single*; Footprint: Converter_DCDC:Converter_DCDC_TRACO_TMR-1-xxxx_Single_THT; Supplier: http://assets.tracopower.com/TMR1/documents/tmr1-datasheet.pdf
footprint Converter_DCDC_TRACO_TMR-1-xxxx_Single_THT
pins: 1 -VIN (power), 2 +VIN (power), 4 +VOUT (power), 6 -VOUT (power)

## TMR_1-1213SM
designator *  value TMR_1-1213SM
ki_keywords: Murata isolated isolation dc-dc converter transformer; ki_description: 67mA Regulated 1W DC/DC converter with 1.5kV isolation, 9V-18V input, 15V fixed Output Voltage, SMD; ki_fp_filters: Converter*DCDC*TRACO*TMR?1SM*; Footprint: Converter_DCDC:Converter_DCDC_TRACO_TMR-1SM_SMD; Supplier: http://assets.tracopower.com/TMR1SM/documents/tmr1sm-datasheet.pdf
footprint Converter_DCDC_TRACO_TMR-1SM_SMD
pins: 1 -VIN (power), 2 Remote_on/off (in), 6 NC (in) hidden, 7 NC (in) hidden, 8 +VOUT (power), 9 -VOUT (power), 14 +VIN (power)

## TMR_1-1215
designator *  value TMR_1-1215
ki_keywords: Murata isolated isolation dc-dc converter transformer; ki_description: 42mA Regulated 1W DC/DC converter with 1.5kV isolation, 9V-18V input, 24V fixed Output Voltage, SIP-6; ki_fp_filters: Converter*DCDC*TRACO*TMR?1*Single*; Footprint: Converter_DCDC:Converter_DCDC_TRACO_TMR-1-xxxx_Single_THT; Supplier: http://assets.tracopower.com/TMR1/documents/tmr1-datasheet.pdf
footprint Converter_DCDC_TRACO_TMR-1-xxxx_Single_THT
pins: 1 -VIN (power), 2 +VIN (power), 4 +VOUT (power), 6 -VOUT (power)